# Altium schematic symbol library jlcpcb_2025_04_inductors_extended_0603.schlib: 1269 symbols (part 5 of 7) (continued)
## PWCWAQ1608F-150KTT (continued)
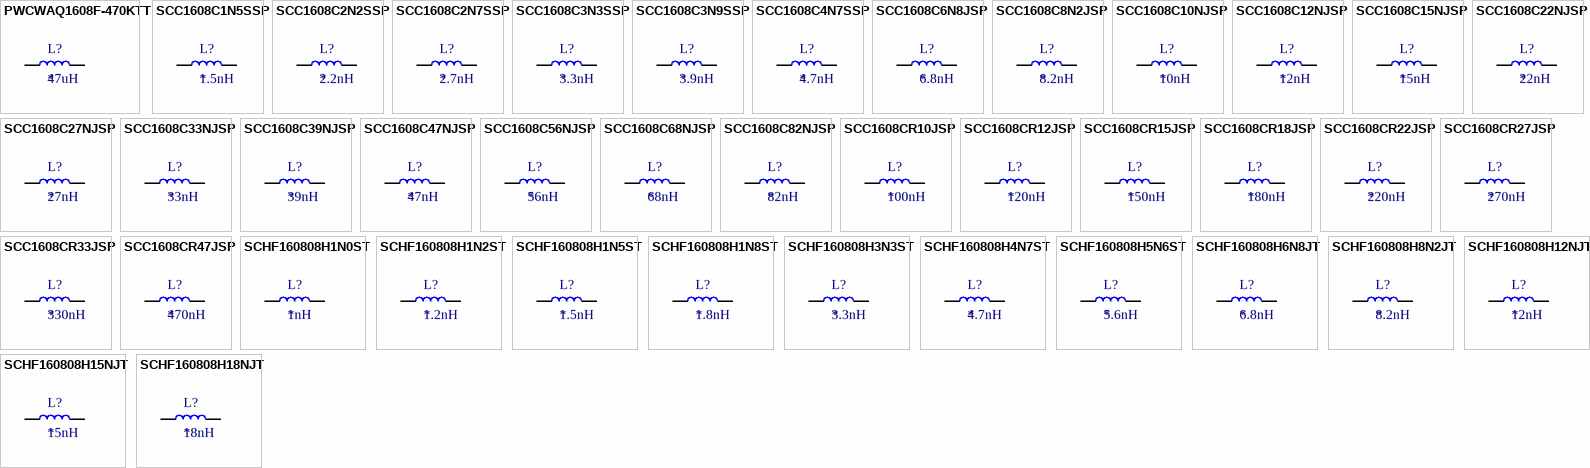
[diagram p23: symbols PWCWAQ1608F-470KTT to SCHF160808H18NJT]

## PWCWAQ1608F-470KTT
designator L?  Inductance: 47uH
Inductor, 47uH, ±10%, 8.645Ω, 100mA, SMD 0603; Manufacturer: PROD Tech; Manufacturer Part Number: PWCWAQ1608F-470KTT; Package Size: 0603; JLCPCB Basic Part: No; JLCPCB Part Number: C2983046; Supplier 1: LCSC; Category: Inductors; Supplier Part Number 1: C2983046; Tolerance: ±10%; Rated Current: 100mA; DC Resistance: 8.645Ω; RoHS: Yes; ComponentLink1Description: Datasheet; ComponentLink1URL: https://wmsc.lcsc.com/wmsc/upload/file/pdf/v2/lcsc/2205051716_PROD-Tech-PWCWAQ1608F-470KTT_C2983046.pdf; ComponentLink2Description: JLCPCB Part URL; ComponentLink2URL: https://jlcpcb.com/partdetail/C2983046; ComponentLink3Description: LCSC Part URL; ComponentLink3URL: https://lcsc.com/product-detail/Inductors-SMD_PROD-Tech-PROD-Tech-PWCWAQ1608F-470KTT_C2983046.html
footprint IND-0603 (0603 (1608M) Inductor)
pins: 1, 2

## SCC1608C1N5SSP
designator L?  Inductance: 1.5nH
Inductor, 1.5nH, 100mΩ, 500mA, SMD 0603; Manufacturer: Sunltech Tech; Manufacturer Part Number: SCC1608C1N5SSP; Package Size: 0603; JLCPCB Basic Part: No; JLCPCB Part Number: C412025; Supplier 1: LCSC; Category: Inductors; Supplier Part Number 1: C412025; Rated Current: 500mA; DC Resistance: 100mΩ; RoHS: Yes; ComponentLink1Description: Datasheet; ComponentLink1URL: https://wmsc.lcsc.com/wmsc/upload/file/pdf/v2/lcsc/2304140030_Sunltech-Tech-SCC1608C1N5SSP_C412025.pdf; ComponentLink2Description: JLCPCB Part URL; ComponentLink2URL: https://jlcpcb.com/partdetail/C412025; ComponentLink3Description: LCSC Part URL; ComponentLink3URL: https://lcsc.com/product-detail/Inductors-SMD_Sunltech-Tech-Sunltech-Tech-SCC1608C1N5SSP_C412025.html
footprint IND-0603 (0603 (1608M) Inductor)
pins: 1, 2

## SCC1608C2N2SSP
designator L?  Inductance: 2.2nH
Inductor, 2.2nH, 200mΩ, 500mA, SMD 0603; Manufacturer: Sunltech Tech; Manufacturer Part Number: SCC1608C2N2SSP; Package Size: 0603; JLCPCB Basic Part: No; JLCPCB Part Number: C412026; Supplier 1: LCSC; Category: Inductors; Supplier Part Number 1: C412026; Rated Current: 500mA; DC Resistance: 200mΩ; RoHS: Yes; ComponentLink1Description: Datasheet; ComponentLink1URL: https://wmsc.lcsc.com/wmsc/upload/file/pdf/v2/lcsc/2304140030_Sunltech-Tech-SCC1608C2N2SSP_C412026.pdf; ComponentLink2Description: JLCPCB Part URL; ComponentLink2URL: https://jlcpcb.com/partdetail/C412026; ComponentLink3Description: LCSC Part URL; ComponentLink3URL: https://lcsc.com/product-detail/Inductors-SMD_Sunltech-Tech-Sunltech-Tech-SCC1608C2N2SSP_C412026.html
footprint IND-0603 (0603 (1608M) Inductor)
pins: 1, 2

## SCC1608C2N7SSP
designator L?  Inductance: 2.7nH
Inductor, 2.7nH, 200mΩ, 500mA, SMD 0603; Manufacturer: Sunltech Tech; Manufacturer Part Number: SCC1608C2N7SSP; Package Size: 0603; JLCPCB Basic Part: No; JLCPCB Part Number: C412027; Supplier 1: LCSC; Category: Inductors; Supplier Part Number 1: C412027; Rated Current: 500mA; DC Resistance: 200mΩ; RoHS: Yes; ComponentLink1Description: Datasheet; ComponentLink1URL: https://wmsc.lcsc.com/wmsc/upload/file/pdf/v2/lcsc/2304140030_Sunltech-Tech-SCC1608C2N7SSP_C412027.pdf; ComponentLink2Description: JLCPCB Part URL; ComponentLink2URL: https://jlcpcb.com/partdetail/C412027; ComponentLink3Description: LCSC Part URL; ComponentLink3URL: https://lcsc.com/product-detail/Inductors-SMD_Sunltech-Tech-Sunltech-Tech-SCC1608C2N7SSP_C412027.html
footprint IND-0603 (0603 (1608M) Inductor)
pins: 1, 2

## SCC1608C3N3SSP
designator L?  Inductance: 3.3nH
Inductor, 3.3nH, 200mΩ, 500mA, SMD 0603; Manufacturer: Sunltech Tech; Manufacturer Part Number: SCC1608C3N3SSP; Package Size: 0603; JLCPCB Basic Part: No; JLCPCB Part Number: C412028; Supplier 1: LCSC; Category: Inductors; Supplier Part Number 1: C412028; Rated Current: 500mA; DC Resistance: 200mΩ; RoHS: Yes; ComponentLink1Description: Datasheet; ComponentLink1URL: https://wmsc.lcsc.com/wmsc/upload/file/pdf/v2/lcsc/2304140030_Sunltech-Tech-SCC1608C3N3SSP_C412028.pdf; ComponentLink2Description: JLCPCB Part URL; ComponentLink2URL: https://jlcpcb.com/partdetail/C412028; ComponentLink3Description: LCSC Part URL; ComponentLink3URL: https://lcsc.com/product-detail/Inductors-SMD_Sunltech-Tech-Sunltech-Tech-SCC1608C3N3SSP_C412028.html
footprint IND-0603 (0603 (1608M) Inductor)
pins: 1, 2

## SCC1608C3N9SSP
designator L?  Inductance: 3.9nH
Inductor, 3.9nH, 200mΩ, 500mA, SMD 0603; Manufacturer: Sunltech Tech; Manufacturer Part Number: SCC1608C3N9SSP; Package Size: 0603; JLCPCB Basic Part: No; JLCPCB Part Number: C412029; Supplier 1: LCSC; Category: Inductors; Supplier Part Number 1: C412029; Rated Current: 500mA; DC Resistance: 200mΩ; RoHS: Yes; ComponentLink1Description: Datasheet; ComponentLink1URL: https://wmsc.lcsc.com/wmsc/upload/file/pdf/v2/lcsc/2304140030_Sunltech-Tech-SCC1608C3N9SSP_C412029.pdf; ComponentLink2Description: JLCPCB Part URL; ComponentLink2URL: https://jlcpcb.com/partdetail/C412029; ComponentLink3Description: LCSC Part URL; ComponentLink3URL: https://lcsc.com/product-detail/Inductors-SMD_Sunltech-Tech-Sunltech-Tech-SCC1608C3N9SSP_C412029.html
footprint IND-0603 (0603 (1608M) Inductor)
pins: 1, 2

## SCC1608C4N7SSP
designator L?  Inductance: 4.7nH
Inductor, 4.7nH, 200mΩ, 500mA, SMD 0603; Manufacturer: Sunltech Tech; Manufacturer Part Number: SCC1608C4N7SSP; Package Size: 0603; JLCPCB Basic Part: No; JLCPCB Part Number: C412030; Supplier 1: LCSC; Category: Inductors; Supplier Part Number 1: C412030; Rated Current: 500mA; DC Resistance: 200mΩ; RoHS: Yes; ComponentLink1Description: Datasheet; ComponentLink1URL: https://wmsc.lcsc.com/wmsc/upload/file/pdf/v2/lcsc/2304140030_Sunltech-Tech-SCC1608C4N7SSP_C412030.pdf; ComponentLink2Description: JLCPCB Part URL; ComponentLink2URL: https://jlcpcb.com/partdetail/C412030; ComponentLink3Description: LCSC Part URL; ComponentLink3URL: https://lcsc.com/product-detail/Inductors-SMD_Sunltech-Tech-Sunltech-Tech-SCC1608C4N7SSP_C412030.html
footprint IND-0603 (0603 (1608M) Inductor)
pins: 1, 2

## SCC1608C6N8JSP
designator L?  Inductance: 6.8nH
Inductor, 6.8nH, ±5%, 300mΩ, 500mA, SMD 0603; Manufacturer: Sunltech Tech; Manufacturer Part Number: SCC1608C6N8JSP; Package Size: 0603; JLCPCB Basic Part: No; JLCPCB Part Number: C412031; Supplier 1: LCSC; Category: Inductors; Supplier Part Number 1: C412031; Tolerance: ±5%; Rated Current: 500mA; DC Resistance: 300mΩ; RoHS: Yes; ComponentLink1Description: Datasheet; ComponentLink1URL: https://wmsc.lcsc.com/wmsc/upload/file/pdf/v2/lcsc/2304140030_Sunltech-Tech-SCC1608C6N8JSP_C412031.pdf; ComponentLink2Description: JLCPCB Part URL; ComponentLink2URL: https://jlcpcb.com/partdetail/C412031; ComponentLink3Description: LCSC Part URL; ComponentLink3URL: https://lcsc.com/product-detail/Inductors-SMD_Sunltech-Tech-Sunltech-Tech-SCC1608C6N8JSP_C412031.html
footprint IND-0603 (0603 (1608M) Inductor)
pins: 1, 2

## SCC1608C8N2JSP
designator L?  Inductance: 8.2nH
Inductor, 8.2nH, ±5%, 300mΩ, 500mA, SMD 0603; Manufacturer: Sunltech Tech; Manufacturer Part Number: SCC1608C8N2JSP; Package Size: 0603; JLCPCB Basic Part: No; JLCPCB Part Number: C412032; Supplier 1: LCSC; Category: Inductors; Supplier Part Number 1: C412032; Tolerance: ±5%; Rated Current: 500mA; DC Resistance: 300mΩ; RoHS: Yes; ComponentLink1Description: Datasheet; ComponentLink1URL: https://wmsc.lcsc.com/wmsc/upload/file/pdf/v2/lcsc/2304140030_Sunltech-Tech-SCC1608C8N2JSP_C412032.pdf; ComponentLink2Description: JLCPCB Part URL; ComponentLink2URL: https://jlcpcb.com/partdetail/C412032; ComponentLink3Description: LCSC Part URL; ComponentLink3URL: https://lcsc.com/product-detail/Inductors-SMD_Sunltech-Tech-Sunltech-Tech-SCC1608C8N2JSP_C412032.html
footprint IND-0603 (0603 (1608M) Inductor)
pins: 1, 2

## SCC1608C10NJSP
designator L?  Inductance: 10nH
Inductor, 10nH, ±5%, 500mΩ, 300mA, SMD 0603; Manufacturer: Sunltech Tech; Manufacturer Part Number: SCC1608C10NJSP; Package Size: 0603; JLCPCB Basic Part: No; JLCPCB Part Number: C412033; Supplier 1: LCSC; Category: Inductors; Supplier Part Number 1: C412033; Tolerance: ±5%; Rated Current: 300mA; DC Resistance: 500mΩ; RoHS: Yes; ComponentLink1Description: Datasheet; ComponentLink1URL: https://wmsc.lcsc.com/wmsc/upload/file/pdf/v2/lcsc/2304140030_Sunltech-Tech-SCC1608C10NJSP_C412033.pdf; ComponentLink2Description: JLCPCB Part URL; ComponentLink2URL: https://jlcpcb.com/partdetail/C412033; ComponentLink3Description: LCSC Part URL; ComponentLink3URL: https://lcsc.com/product-detail/Inductors-SMD_Sunltech-Tech-Sunltech-Tech-SCC1608C10NJSP_C412033.html
footprint IND-0603 (0603 (1608M) Inductor)
pins: 1, 2

## SCC1608C12NJSP
designator L?  Inductance: 12nH
Inductor, 12nH, ±5%, 500mΩ, 300mA, SMD 0603; Manufacturer: Sunltech Tech; Manufacturer Part Number: SCC1608C12NJSP; Package Size: 0603; JLCPCB Basic Part: No; JLCPCB Part Number: C412034; Supplier 1: LCSC; Category: Inductors; Supplier Part Number 1: C412034; Tolerance: ±5%; Rated Current: 300mA; DC Resistance: 500mΩ; RoHS: Yes; ComponentLink1Description: Datasheet; ComponentLink1URL: https://wmsc.lcsc.com/wmsc/upload/file/pdf/v2/lcsc/2304140030_Sunltech-Tech-SCC1608C12NJSP_C412034.pdf; ComponentLink2Description: JLCPCB Part URL; ComponentLink2URL: https://jlcpcb.com/partdetail/C412034; ComponentLink3Description: LCSC Part URL; ComponentLink3URL: https://lcsc.com/product-detail/Inductors-SMD_Sunltech-Tech-Sunltech-Tech-SCC1608C12NJSP_C412034.html
footprint IND-0603 (0603 (1608M) Inductor)
pins: 1, 2

## SCC1608C15NJSP
designator L?  Inductance: 15nH
Inductor, 15nH, ±5%, 600mΩ, 300mA, SMD 0603; Manufacturer: Sunltech Tech; Manufacturer Part Number: SCC1608C15NJSP; Package Size: 0603; JLCPCB Basic Part: No; JLCPCB Part Number: C412035; Supplier 1: LCSC; Category: Inductors; Supplier Part Number 1: C412035; Tolerance: ±5%; Rated Current: 300mA; DC Resistance: 600mΩ; RoHS: Yes; ComponentLink1Description: Datasheet; ComponentLink1URL: https://wmsc.lcsc.com/wmsc/upload/file/pdf/v2/lcsc/2304140030_Sunltech-Tech-SCC1608C15NJSP_C412035.pdf; ComponentLink2Description: JLCPCB Part URL; ComponentLink2URL: https://jlcpcb.com/partdetail/C412035; ComponentLink3Description: LCSC Part URL; ComponentLink3URL: https://lcsc.com/product-detail/Inductors-SMD_Sunltech-Tech-Sunltech-Tech-SCC1608C15NJSP_C412035.html
footprint IND-0603 (0603 (1608M) Inductor)
pins: 1, 2

## SCC1608C22NJSP
designator L?  Inductance: 22nH
Inductor, 22nH, ±5%, 600mΩ, 300mA, SMD 0603; Manufacturer: Sunltech Tech; Manufacturer Part Number: SCC1608C22NJSP; Package Size: 0603; JLCPCB Basic Part: No; JLCPCB Part Number: C412036; Supplier 1: LCSC; Category: Inductors; Supplier Part Number 1: C412036; Tolerance: ±5%; Rated Current: 300mA; DC Resistance: 600mΩ; RoHS: Yes; ComponentLink1Description: Datasheet; ComponentLink1URL: https://wmsc.lcsc.com/wmsc/upload/file/pdf/v2/lcsc/2304140030_Sunltech-Tech-SCC1608C22NJSP_C412036.pdf; ComponentLink2Description: JLCPCB Part URL; ComponentLink2URL: https://jlcpcb.com/partdetail/C412036; ComponentLink3Description: LCSC Part URL; ComponentLink3URL: https://lcsc.com/product-detail/Inductors-SMD_Sunltech-Tech-Sunltech-Tech-SCC1608C22NJSP_C412036.html
footprint IND-0603 (0603 (1608M) Inductor)
pins: 1, 2

## SCC1608C27NJSP
designator L?  Inductance: 27nH
Inductor, 27nH, ±5%, 800mΩ, 300mA, SMD 0603; Manufacturer: Sunltech Tech; Manufacturer Part Number: SCC1608C27NJSP; Package Size: 0603; JLCPCB Basic Part: No; JLCPCB Part Number: C412037; Supplier 1: LCSC; Category: Inductors; Supplier Part Number 1: C412037; Tolerance: ±5%; Rated Current: 300mA; DC Resistance: 800mΩ; RoHS: Yes; ComponentLink1Description: Datasheet; ComponentLink1URL: https://wmsc.lcsc.com/wmsc/upload/file/pdf/v2/lcsc/2304140030_Sunltech-Tech-SCC1608C27NJSP_C412037.pdf; ComponentLink2Description: JLCPCB Part URL; ComponentLink2URL: https://jlcpcb.com/partdetail/C412037; ComponentLink3Description: LCSC Part URL; ComponentLink3URL: https://lcsc.com/product-detail/Inductors-SMD_Sunltech-Tech-Sunltech-Tech-SCC1608C27NJSP_C412037.html
footprint IND-0603 (0603 (1608M) Inductor)
pins: 1, 2

## SCC1608C33NJSP
designator L?  Inductance: 33nH
Inductor, 33nH, ±5%, 800mΩ, 300mA, SMD 0603; Manufacturer: Sunltech Tech; Manufacturer Part Number: SCC1608C33NJSP; Package Size: 0603; JLCPCB Basic Part: No; JLCPCB Part Number: C412038; Supplier 1: LCSC; Category: Inductors; Supplier Part Number 1: C412038; Tolerance: ±5%; Rated Current: 300mA; DC Resistance: 800mΩ; RoHS: Yes; ComponentLink1Description: Datasheet; ComponentLink1URL: https://wmsc.lcsc.com/wmsc/upload/file/pdf/v2/lcsc/2304140030_Sunltech-Tech-SCC1608C33NJSP_C412038.pdf; ComponentLink2Description: JLCPCB Part URL; ComponentLink2URL: https://jlcpcb.com/partdetail/C412038; ComponentLink3Description: LCSC Part URL; ComponentLink3URL: https://lcsc.com/product-detail/Inductors-SMD_Sunltech-Tech-Sunltech-Tech-SCC1608C33NJSP_C412038.html
footprint IND-0603 (0603 (1608M) Inductor)
pins: 1, 2

## SCC1608C39NJSP
designator L?  Inductance: 39nH
Inductor, 39nH, ±5%, 800mΩ, 300mA, SMD 0603; Manufacturer: Sunltech Tech; Manufacturer Part Number: SCC1608C39NJSP; Package Size: 0603; JLCPCB Basic Part: No; JLCPCB Part Number: C412039; Supplier 1: LCSC; Category: Inductors; Supplier Part Number 1: C412039; Tolerance: ±5%; Rated Current: 300mA; DC Resistance: 800mΩ; RoHS: Yes; ComponentLink1Description: Datasheet; ComponentLink1URL: https://wmsc.lcsc.com/wmsc/upload/file/pdf/v2/lcsc/2304140030_Sunltech-Tech-SCC1608C39NJSP_C412039.pdf; ComponentLink2Description: JLCPCB Part URL; ComponentLink2URL: https://jlcpcb.com/partdetail/C412039; ComponentLink3Description: LCSC Part URL; ComponentLink3URL: https://lcsc.com/product-detail/Inductors-SMD_Sunltech-Tech-Sunltech-Tech-SCC1608C39NJSP_C412039.html
footprint IND-0603 (0603 (1608M) Inductor)
pins: 1, 2

## SCC1608C47NJSP
designator L?  Inductance: 47nH
Inductor, 47nH, ±5%, 1Ω, 300mA, SMD 0603; Manufacturer: Sunltech Tech; Manufacturer Part Number: SCC1608C47NJSP; Package Size: 0603; JLCPCB Basic Part: No; JLCPCB Part Number: C412040; Supplier 1: LCSC; Category: Inductors; Supplier Part Number 1: C412040; Tolerance: ±5%; Rated Current: 300mA; DC Resistance: 1Ω; RoHS: Yes; ComponentLink1Description: Datasheet; ComponentLink1URL: https://wmsc.lcsc.com/wmsc/upload/file/pdf/v2/lcsc/2304140030_Sunltech-Tech-SCC1608C47NJSP_C412040.pdf; ComponentLink2Description: JLCPCB Part URL; ComponentLink2URL: https://jlcpcb.com/partdetail/C412040; ComponentLink3Description: LCSC Part URL; ComponentLink3URL: https://lcsc.com/product-detail/Inductors-SMD_Sunltech-Tech-Sunltech-Tech-SCC1608C47NJSP_C412040.html
footprint IND-0603 (0603 (1608M) Inductor)
pins: 1, 2

## SCC1608C56NJSP
designator L?  Inductance: 56nH
Inductor, 56nH, ±5%, 1Ω, 300mA, SMD 0603; Manufacturer: Sunltech Tech; Manufacturer Part Number: SCC1608C56NJSP; Package Size: 0603; JLCPCB Basic Part: No; JLCPCB Part Number: C412041; Supplier 1: LCSC; Category: Inductors; Supplier Part Number 1: C412041; Tolerance: ±5%; Rated Current: 300mA; DC Resistance: 1Ω; RoHS: Yes; ComponentLink1Description: Datasheet; ComponentLink1URL: https://wmsc.lcsc.com/wmsc/upload/file/pdf/v2/lcsc/2304140030_Sunltech-Tech-SCC1608C56NJSP_C412041.pdf; ComponentLink2Description: JLCPCB Part URL; ComponentLink2URL: https://jlcpcb.com/partdetail/C412041; ComponentLink3Description: LCSC Part URL; ComponentLink3URL: https://lcsc.com/product-detail/Inductors-SMD_Sunltech-Tech-Sunltech-Tech-SCC1608C56NJSP_C412041.html
footprint IND-0603 (0603 (1608M) Inductor)
pins: 1, 2

## SCC1608C68NJSP
designator L?  Inductance: 68nH
Inductor, 68nH, ±5%, 1Ω, 300mA, SMD 0603; Manufacturer: Sunltech Tech; Manufacturer Part Number: SCC1608C68NJSP; Package Size: 0603; JLCPCB Basic Part: No; JLCPCB Part Number: C412042; Supplier 1: LCSC; Category: Inductors; Supplier Part Number 1: C412042; Tolerance: ±5%; Rated Current: 300mA; DC Resistance: 1Ω; RoHS: Yes; ComponentLink1Description: Datasheet; ComponentLink1URL: https://wmsc.lcsc.com/wmsc/upload/file/pdf/v2/lcsc/2304140030_Sunltech-Tech-SCC1608C68NJSP_C412042.pdf; ComponentLink2Description: JLCPCB Part URL; ComponentLink2URL: https://jlcpcb.com/partdetail/C412042; ComponentLink3Description: LCSC Part URL; ComponentLink3URL: https://lcsc.com/product-detail/Inductors-SMD_Sunltech-Tech-Sunltech-Tech-SCC1608C68NJSP_C412042.html
footprint IND-0603 (0603 (1608M) Inductor)
pins: 1, 2

## SCC1608C82NJSP
designator L?  Inductance: 82nH
Inductor, 82nH, ±5%, 1Ω, 300mA, SMD 0603; Manufacturer: Sunltech Tech; Manufacturer Part Number: SCC1608C82NJSP; Package Size: 0603; JLCPCB Basic Part: No; JLCPCB Part Number: C412043; Supplier 1: LCSC; Category: Inductors; Supplier Part Number 1: C412043; Tolerance: ±5%; Rated Current: 300mA; DC Resistance: 1Ω; RoHS: Yes; ComponentLink1Description: Datasheet; ComponentLink1URL: https://wmsc.lcsc.com/wmsc/upload/file/pdf/v2/lcsc/2304140030_Sunltech-Tech-SCC1608C82NJSP_C412043.pdf; ComponentLink2Description: JLCPCB Part URL; ComponentLink2URL: https://jlcpcb.com/partdetail/C412043; ComponentLink3Description: LCSC Part URL; ComponentLink3URL: https://lcsc.com/product-detail/Inductors-SMD_Sunltech-Tech-Sunltech-Tech-SCC1608C82NJSP_C412043.html
footprint IND-0603 (0603 (1608M) Inductor)
pins: 1, 2

## SCC1608CR10JSP
designator L?  Inductance: 100nH
Inductor, 100nH, ±5%, 1.2Ω, 300mA, SMD 0603; Manufacturer: Sunltech Tech; Manufacturer Part Number: SCC1608CR10JSP; Package Size: 0603; JLCPCB Basic Part: No; JLCPCB Part Number: C412044; Supplier 1: LCSC; Category: Inductors; Supplier Part Number 1: C412044; Tolerance: ±5%; Rated Current: 300mA; DC Resistance: 1.2Ω; RoHS: Yes; ComponentLink1Description: Datasheet; ComponentLink1URL: https://wmsc.lcsc.com/wmsc/upload/file/pdf/v2/lcsc/2304140030_Sunltech-Tech-SCC1608CR10JSP_C412044.pdf; ComponentLink2Description: JLCPCB Part URL; ComponentLink2URL: https://jlcpcb.com/partdetail/C412044; ComponentLink3Description: LCSC Part URL; ComponentLink3URL: https://lcsc.com/product-detail/Inductors-SMD_Sunltech-Tech-Sunltech-Tech-SCC1608CR10JSP_C412044.html
footprint IND-0603 (0603 (1608M) Inductor)
pins: 1, 2

## SCC1608CR12JSP
designator L?  Inductance: 120nH
Inductor, 120nH, ±5%, 1.4Ω, 200mA, SMD 0603; Manufacturer: Sunltech Tech; Manufacturer Part Number: SCC1608CR12JSP; Package Size: 0603; JLCPCB Basic Part: No; JLCPCB Part Number: C412045; Supplier 1: LCSC; Category: Inductors; Supplier Part Number 1: C412045; Tolerance: ±5%; Rated Current: 200mA; DC Resistance: 1.4Ω; RoHS: Yes; ComponentLink1Description: Datasheet; ComponentLink1URL: https://wmsc.lcsc.com/wmsc/upload/file/pdf/v2/lcsc/2304140030_Sunltech-Tech-SCC1608CR12JSP_C412045.pdf; ComponentLink2Description: JLCPCB Part URL; ComponentLink2URL: https://jlcpcb.com/partdetail/C412045; ComponentLink3Description: LCSC Part URL; ComponentLink3URL: https://lcsc.com/product-detail/Inductors-SMD_Sunltech-Tech-Sunltech-Tech-SCC1608CR12JSP_C412045.html
footprint IND-0603 (0603 (1608M) Inductor)
pins: 1, 2

## SCC1608CR15JSP
designator L?  Inductance: 150nH
Inductor, 150nH, ±5%, 1.6Ω, 200mA, SMD 0603; Manufacturer: Sunltech Tech; Manufacturer Part Number: SCC1608CR15JSP; Package Size: 0603; JLCPCB Basic Part: No; JLCPCB Part Number: C412046; Supplier 1: LCSC; Category: Inductors; Supplier Part Number 1: C412046; Tolerance: ±5%; Rated Current: 200mA; DC Resistance: 1.6Ω; RoHS: Yes; ComponentLink1Description: Datasheet; ComponentLink1URL: https://wmsc.lcsc.com/wmsc/upload/file/pdf/v2/lcsc/2304140030_Sunltech-Tech-SCC1608CR15JSP_C412046.pdf; ComponentLink2Description: JLCPCB Part URL; ComponentLink2URL: https://jlcpcb.com/partdetail/C412046; ComponentLink3Description: LCSC Part URL; ComponentLink3URL: https://lcsc.com/product-detail/Inductors-SMD_Sunltech-Tech-Sunltech-Tech-SCC1608CR15JSP_C412046.html
footprint IND-0603 (0603 (1608M) Inductor)
pins: 1, 2

## SCC1608CR18JSP
designator L?  Inductance: 180nH
Inductor, 180nH, ±5%, 1.9Ω, 200mA, SMD 0603; Manufacturer: Sunltech Tech; Manufacturer Part Number: SCC1608CR18JSP; Package Size: 0603; JLCPCB Basic Part: No; JLCPCB Part Number: C412047; Supplier 1: LCSC; Category: Inductors; Supplier Part Number 1: C412047; Tolerance: ±5%; Rated Current: 200mA; DC Resistance: 1.9Ω; RoHS: Yes; ComponentLink1Description: Datasheet; ComponentLink1URL: https://wmsc.lcsc.com/wmsc/upload/file/pdf/v2/lcsc/2304140030_Sunltech-Tech-SCC1608CR18JSP_C412047.pdf; ComponentLink2Description: JLCPCB Part URL; ComponentLink2URL: https://jlcpcb.com/partdetail/C412047; ComponentLink3Description: LCSC Part URL; ComponentLink3URL: https://lcsc.com/product-detail/Inductors-SMD_Sunltech-Tech-Sunltech-Tech-SCC1608CR18JSP_C412047.html
footprint IND-0603 (0603 (1608M) Inductor)
pins: 1, 2

## SCC1608CR22JSP
designator L?  Inductance: 220nH
Inductor, 220nH, ±5%, 2.4Ω, 200mA, SMD 0603; Manufacturer: Sunltech Tech; Manufacturer Part Number: SCC1608CR22JSP; Package Size: 0603; JLCPCB Basic Part: No; JLCPCB Part Number: C412048; Supplier 1: LCSC; Category: Inductors; Supplier Part Number 1: C412048; Tolerance: ±5%; Rated Current: 200mA; DC Resistance: 2.4Ω; RoHS: Yes; ComponentLink1Description: Datasheet; ComponentLink1URL: https://wmsc.lcsc.com/wmsc/upload/file/pdf/v2/lcsc/2304140030_Sunltech-Tech-SCC1608CR22JSP_C412048.pdf; ComponentLink2Description: JLCPCB Part URL; ComponentLink2URL: https://jlcpcb.com/partdetail/C412048; ComponentLink3Description: LCSC Part URL; ComponentLink3URL: https://lcsc.com/product-detail/Inductors-SMD_Sunltech-Tech-Sunltech-Tech-SCC1608CR22JSP_C412048.html
footprint IND-0603 (0603 (1608M) Inductor)
pins: 1, 2

## SCC1608CR27JSP
designator L?  Inductance: 270nH
Inductor, 270nH, ±5%, 2.6Ω, 150mA, SMD 0603; Manufacturer: Sunltech Tech; Manufacturer Part Number: SCC1608CR27JSP; Package Size: 0603; JLCPCB Basic Part: No; JLCPCB Part Number: C412049; Supplier 1: LCSC; Category: Inductors; Supplier Part Number 1: C412049; Tolerance: ±5%; Rated Current: 150mA; DC Resistance: 2.6Ω; RoHS: Yes; ComponentLink1Description: Datasheet; ComponentLink1URL: https://wmsc.lcsc.com/wmsc/upload/file/pdf/v2/lcsc/2304140030_Sunltech-Tech-SCC1608CR27JSP_C412049.pdf; ComponentLink2Description: JLCPCB Part URL; ComponentLink2URL: https://jlcpcb.com/partdetail/C412049; ComponentLink3Description: LCSC Part URL; ComponentLink3URL: https://lcsc.com/product-detail/Inductors-SMD_Sunltech-Tech-Sunltech-Tech-SCC1608CR27JSP_C412049.html
footprint IND-0603 (0603 (1608M) Inductor)
pins: 1, 2

## SCC1608CR33JSP
designator L?  Inductance: 330nH
Inductor, 330nH, ±5%, 2.8Ω, 150mA, SMD 0603; Manufacturer: Sunltech Tech; Manufacturer Part Number: SCC1608CR33JSP; Package Size: 0603; JLCPCB Basic Part: No; JLCPCB Part Number: C412050; Supplier 1: LCSC; Category: Inductors; Supplier Part Number 1: C412050; Tolerance: ±5%; Rated Current: 150mA; DC Resistance: 2.8Ω; RoHS: Yes; ComponentLink1Description: Datasheet; ComponentLink1URL: https://wmsc.lcsc.com/wmsc/upload/file/pdf/v2/lcsc/2304140030_Sunltech-Tech-SCC1608CR33JSP_C412050.pdf; ComponentLink2Description: JLCPCB Part URL; ComponentLink2URL: https://jlcpcb.com/partdetail/C412050; ComponentLink3Description: LCSC Part URL; ComponentLink3URL: https://lcsc.com/product-detail/Inductors-SMD_Sunltech-Tech-Sunltech-Tech-SCC1608CR33JSP_C412050.html
footprint IND-0603 (0603 (1608M) Inductor)
pins: 1, 2

## SCC1608CR47JSP
designator L?  Inductance: 470nH
Inductor, 470nH, ±5%, 3.6Ω, 150mA, SMD 0603; Manufacturer: Sunltech Tech; Manufacturer Part Number: SCC1608CR47JSP; Package Size: 0603; JLCPCB Basic Part: No; JLCPCB Part Number: C412052; Supplier 1: LCSC; Category: Inductors; Supplier Part Number 1: C412052; Tolerance: ±5%; Rated Current: 150mA; DC Resistance: 3.6Ω; RoHS: Yes; ComponentLink1Description: Datasheet; ComponentLink1URL: https://wmsc.lcsc.com/wmsc/upload/file/pdf/v2/lcsc/1912111437_Sunltech-Tech-SCC1608CR47JSP_C412052.pdf; ComponentLink2Description: JLCPCB Part URL; ComponentLink2URL: https://jlcpcb.com/partdetail/C412052; ComponentLink3Description: LCSC Part URL; ComponentLink3URL: https://lcsc.com/product-detail/Inductors-SMD_Sunltech-Tech-Sunltech-Tech-SCC1608CR47JSP_C412052.html
footprint IND-0603 (0603 (1608M) Inductor)
pins: 1, 2

## SCHF160808H1N0ST
designator L?  Inductance: 1nH
Inductor, 1nH, 50mΩ, 500mA, SMD 0603; Manufacturer: Yanchuang; Manufacturer Part Number: SCHF160808H1N0ST; Package Size: 0603; JLCPCB Basic Part: No; JLCPCB Part Number: C577981; Supplier 1: LCSC; Category: Inductors; Supplier Part Number 1: C577981; Rated Current: 500mA; DC Resistance: 50mΩ; RoHS: Yes; ComponentLink1Description: Datasheet; ComponentLink1URL: https://wmsc.lcsc.com/wmsc/upload/file/pdf/v2/lcsc/2304140030_Yanchuang-SCHF160808H1N0ST_C577981.pdf; ComponentLink2Description: JLCPCB Part URL; ComponentLink2URL: https://jlcpcb.com/partdetail/C577981; ComponentLink3Description: LCSC Part URL; ComponentLink3URL: https://lcsc.com/product-detail/Inductors-SMD_Yanchuang-Yanchuang-SCHF160808H1N0ST_C577981.html
footprint IND-0603 (0603 (1608M) Inductor)
pins: 1, 2

## SCHF160808H1N2ST
designator L?  Inductance: 1.2nH
Inductor, 1.2nH, 100mΩ, 500mA, SMD 0603; Manufacturer: Yanchuang; Manufacturer Part Number: SCHF160808H1N2ST; Package Size: 0603; JLCPCB Basic Part: No; JLCPCB Part Number: C577982; Supplier 1: LCSC; Category: Inductors; Supplier Part Number 1: C577982; Rated Current: 500mA; DC Resistance: 100mΩ; RoHS: Yes; ComponentLink1Description: Datasheet; ComponentLink1URL: https://wmsc.lcsc.com/wmsc/upload/file/pdf/v2/lcsc/2304140030_Yanchuang-SCHF160808H1N2ST_C577982.pdf; ComponentLink2Description: JLCPCB Part URL; ComponentLink2URL: https://jlcpcb.com/partdetail/C577982; ComponentLink3Description: LCSC Part URL; ComponentLink3URL: https://lcsc.com/product-detail/Inductors-SMD_Yanchuang-Yanchuang-SCHF160808H1N2ST_C577982.html
footprint IND-0603 (0603 (1608M) Inductor)
pins: 1, 2

## SCHF160808H1N5ST
designator L?  Inductance: 1.5nH
Inductor, 1.5nH, 100mΩ, 400mA, SMD 0603; Manufacturer: Yanchuang; Manufacturer Part Number: SCHF160808H1N5ST; Package Size: 0603; JLCPCB Basic Part: No; JLCPCB Part Number: C577983; Supplier 1: LCSC; Category: Inductors; Supplier Part Number 1: C577983; Rated Current: 400mA; DC Resistance: 100mΩ; RoHS: Yes; ComponentLink1Description: Datasheet; ComponentLink1URL: https://wmsc.lcsc.com/wmsc/upload/file/pdf/v2/lcsc/2304140030_Yanchuang-SCHF160808H1N5ST_C577983.pdf; ComponentLink2Description: JLCPCB Part URL; ComponentLink2URL: https://jlcpcb.com/partdetail/C577983; ComponentLink3Description: LCSC Part URL; ComponentLink3URL: https://lcsc.com/product-detail/Inductors-SMD_Yanchuang-Yanchuang-SCHF160808H1N5ST_C577983.html
footprint IND-0603 (0603 (1608M) Inductor)
pins: 1, 2

## SCHF160808H1N8ST
designator L?  Inductance: 1.8nH
Inductor, 1.8nH, 120mΩ, 400mA, SMD 0603; Manufacturer: Yanchuang; Manufacturer Part Number: SCHF160808H1N8ST; Package Size: 0603; JLCPCB Basic Part: No; JLCPCB Part Number: C577984; Supplier 1: LCSC; Category: Inductors; Supplier Part Number 1: C577984; Rated Current: 400mA; DC Resistance: 120mΩ; RoHS: Yes; ComponentLink1Description: Datasheet; ComponentLink1URL: https://wmsc.lcsc.com/wmsc/upload/file/pdf/v2/lcsc/2304140030_Yanchuang-SCHF160808H1N8ST_C577984.pdf; ComponentLink2Description: JLCPCB Part URL; ComponentLink2URL: https://jlcpcb.com/partdetail/C577984; ComponentLink3Description: LCSC Part URL; ComponentLink3URL: https://lcsc.com/product-detail/Inductors-SMD_Yanchuang-Yanchuang-SCHF160808H1N8ST_C577984.html
footprint IND-0603 (0603 (1608M) Inductor)
pins: 1, 2

## SCHF160808H3N3ST
designator L?  Inductance: 3.3nH
Inductor, 3.3nH, 200mΩ, 400mA, SMD 0603; Manufacturer: Yanchuang; Manufacturer Part Number: SCHF160808H3N3ST; Package Size: 0603; JLCPCB Basic Part: No; JLCPCB Part Number: C577987; Supplier 1: LCSC; Category: Inductors; Supplier Part Number 1: C577987; Rated Current: 400mA; DC Resistance: 200mΩ; RoHS: Yes; ComponentLink1Description: Datasheet; ComponentLink1URL: https://wmsc.lcsc.com/wmsc/upload/file/pdf/v2/lcsc/2304140030_Yanchuang-SCHF160808H3N3ST_C577987.pdf; ComponentLink2Description: JLCPCB Part URL; ComponentLink2URL: https://jlcpcb.com/partdetail/C577987; ComponentLink3Description: LCSC Part URL; ComponentLink3URL: https://lcsc.com/product-detail/Inductors-SMD_Yanchuang-Yanchuang-SCHF160808H3N3ST_C577987.html
footprint IND-0603 (0603 (1608M) Inductor)
pins: 1, 2

## SCHF160808H4N7ST
designator L?  Inductance: 4.7nH
Inductor, 4.7nH, 300mΩ, 400mA, SMD 0603; Manufacturer: Yanchuang; Manufacturer Part Number: SCHF160808H4N7ST; Package Size: 0603; JLCPCB Basic Part: No; JLCPCB Part Number: C577989; Supplier 1: LCSC; Category: Inductors; Supplier Part Number 1: C577989; Rated Current: 400mA; DC Resistance: 300mΩ; RoHS: Yes; ComponentLink1Description: Datasheet; ComponentLink1URL: https://wmsc.lcsc.com/wmsc/upload/file/pdf/v2/lcsc/2304140030_Yanchuang-SCHF160808H4N7ST_C577989.pdf; ComponentLink2Description: JLCPCB Part URL; ComponentLink2URL: https://jlcpcb.com/partdetail/C577989; ComponentLink3Description: LCSC Part URL; ComponentLink3URL: https://lcsc.com/product-detail/Inductors-SMD_Yanchuang-Yanchuang-SCHF160808H4N7ST_C577989.html
footprint IND-0603 (0603 (1608M) Inductor)
pins: 1, 2

## SCHF160808H5N6ST
designator L?  Inductance: 5.6nH
Inductor, 5.6nH, 300mΩ, 400mA, SMD 0603; Manufacturer: Yanchuang; Manufacturer Part Number: SCHF160808H5N6ST; Package Size: 0603; JLCPCB Basic Part: No; JLCPCB Part Number: C577990; Supplier 1: LCSC; Category: Inductors; Supplier Part Number 1: C577990; Rated Current: 400mA; DC Resistance: 300mΩ; RoHS: Yes; ComponentLink1Description: Datasheet; ComponentLink1URL: https://wmsc.lcsc.com/wmsc/upload/file/pdf/v2/lcsc/2304140030_Yanchuang-SCHF160808H5N6ST_C577990.pdf; ComponentLink2Description: JLCPCB Part URL; ComponentLink2URL: https://jlcpcb.com/partdetail/C577990; ComponentLink3Description: LCSC Part URL; ComponentLink3URL: https://lcsc.com/product-detail/Inductors-SMD_Yanchuang-Yanchuang-SCHF160808H5N6ST_C577990.html
footprint IND-0603 (0603 (1608M) Inductor)
pins: 1, 2

## SCHF160808H6N8JT
designator L?  Inductance: 6.8nH
Inductor, 6.8nH, ±5%, 350mΩ, 400mA, SMD 0603; Manufacturer: Yanchuang; Manufacturer Part Number: SCHF160808H6N8JT; Package Size: 0603; JLCPCB Basic Part: No; JLCPCB Part Number: C577991; Supplier 1: LCSC; Category: Inductors; Supplier Part Number 1: C577991; Tolerance: ±5%; Rated Current: 400mA; DC Resistance: 350mΩ; RoHS: Yes; ComponentLink1Description: Datasheet; ComponentLink1URL: https://wmsc.lcsc.com/wmsc/upload/file/pdf/v2/lcsc/2304140030_Yanchuang-SCHF160808H6N8JT_C577991.pdf; ComponentLink2Description: JLCPCB Part URL; ComponentLink2URL: https://jlcpcb.com/partdetail/C577991; ComponentLink3Description: LCSC Part URL; ComponentLink3URL: https://lcsc.com/product-detail/Inductors-SMD_Yanchuang-Yanchuang-SCHF160808H6N8JT_C577991.html
footprint IND-0603 (0603 (1608M) Inductor)
pins: 1, 2

## SCHF160808H8N2JT
designator L?  Inductance: 8.2nH
Inductor, 8.2nH, ±5%, 350mΩ, 400mA, SMD 0603; Manufacturer: Yanchuang; Manufacturer Part Number: SCHF160808H8N2JT; Package Size: 0603; JLCPCB Basic Part: No; JLCPCB Part Number: C577992; Supplier 1: LCSC; Category: Inductors; Supplier Part Number 1: C577992; Tolerance: ±5%; Rated Current: 400mA; DC Resistance: 350mΩ; RoHS: Yes; ComponentLink1Description: Datasheet; ComponentLink1URL: https://wmsc.lcsc.com/wmsc/upload/file/pdf/v2/lcsc/2304140030_Yanchuang-SCHF160808H8N2JT_C577992.pdf; ComponentLink2Description: JLCPCB Part URL; ComponentLink2URL: https://jlcpcb.com/partdetail/C577992; ComponentLink3Description: LCSC Part URL; ComponentLink3URL: https://lcsc.com/product-detail/Inductors-SMD_Yanchuang-Yanchuang-SCHF160808H8N2JT_C577992.html
footprint IND-0603 (0603 (1608M) Inductor)
pins: 1, 2

## SCHF160808H12NJT
designator L?  Inductance: 12nH
Inductor, 12nH, ±5%, 400mΩ, 300mA, SMD 0603; Manufacturer: Yanchuang; Manufacturer Part Number: SCHF160808H12NJT; Package Size: 0603; JLCPCB Basic Part: No; JLCPCB Part Number: C577994; Supplier 1: LCSC; Category: Inductors; Supplier Part Number 1: C577994; Tolerance: ±5%; Rated Current: 300mA; DC Resistance: 400mΩ; RoHS: Yes; ComponentLink1Description: Datasheet; ComponentLink1URL: https://wmsc.lcsc.com/wmsc/upload/file/pdf/v2/lcsc/2304140030_Yanchuang-SCHF160808H12NJT_C577994.pdf; ComponentLink2Description: JLCPCB Part URL; ComponentLink2URL: https://jlcpcb.com/partdetail/C577994; ComponentLink3Description: LCSC Part URL; ComponentLink3URL: https://lcsc.com/product-detail/Inductors-SMD_Yanchuang-Yanchuang-SCHF160808H12NJT_C577994.html
footprint IND-0603 (0603 (1608M) Inductor)
pins: 1, 2

## SCHF160808H15NJT
designator L?  Inductance: 15nH
Inductor, 15nH, ±5%, 450mΩ, 300mA, SMD 0603; Manufacturer: Yanchuang; Manufacturer Part Number: SCHF160808H15NJT; Package Size: 0603; JLCPCB Basic Part: No; JLCPCB Part Number: C577995; Supplier 1: LCSC; Category: Inductors; Supplier Part Number 1: C577995; Tolerance: ±5%; Rated Current: 300mA; DC Resistance: 450mΩ; RoHS: Yes; ComponentLink1Description: Datasheet; ComponentLink1URL: https://wmsc.lcsc.com/wmsc/upload/file/pdf/v2/lcsc/2304140030_Yanchuang-SCHF160808H15NJT_C577995.pdf; ComponentLink2Description: JLCPCB Part URL; ComponentLink2URL: https://jlcpcb.com/partdetail/C577995; ComponentLink3Description: LCSC Part URL; ComponentLink3URL: https://lcsc.com/product-detail/Inductors-SMD_Yanchuang-Yanchuang-SCHF160808H15NJT_C577995.html
footprint IND-0603 (0603 (1608M) Inductor)
pins: 1, 2

## SCHF160808H18NJT
designator L?  Inductance: 18nH
Inductor, 18nH, ±5%, 600mΩ, 300mA, SMD 0603; Manufacturer: Yanchuang; Manufacturer Part Number: SCHF160808H18NJT; Package Size: 0603; JLCPCB Basic Part: No; JLCPCB Part Number: C577996; Supplier 1: LCSC; Category: Inductors; Supplier Part Number 1: C577996; Tolerance: ±5%; Rated Current: 300mA; DC Resistance: 600mΩ; RoHS: Yes; ComponentLink1Description: Datasheet; ComponentLink1URL: https://wmsc.lcsc.com/wmsc/upload/file/pdf/v2/lcsc/2304140030_Yanchuang-SCHF160808H18NJT_C577996.pdf; ComponentLink2Description: JLCPCB Part URL; ComponentLink2URL: https://jlcpcb.com/partdetail/C577996; ComponentLink3Description: LCSC Part URL; ComponentLink3URL: https://lcsc.com/product-detail/Inductors-SMD_Yanchuang-Yanchuang-SCHF160808H18NJT_C577996.html
footprint IND-0603 (0603 (1608M) Inductor)
pins: 1, 2

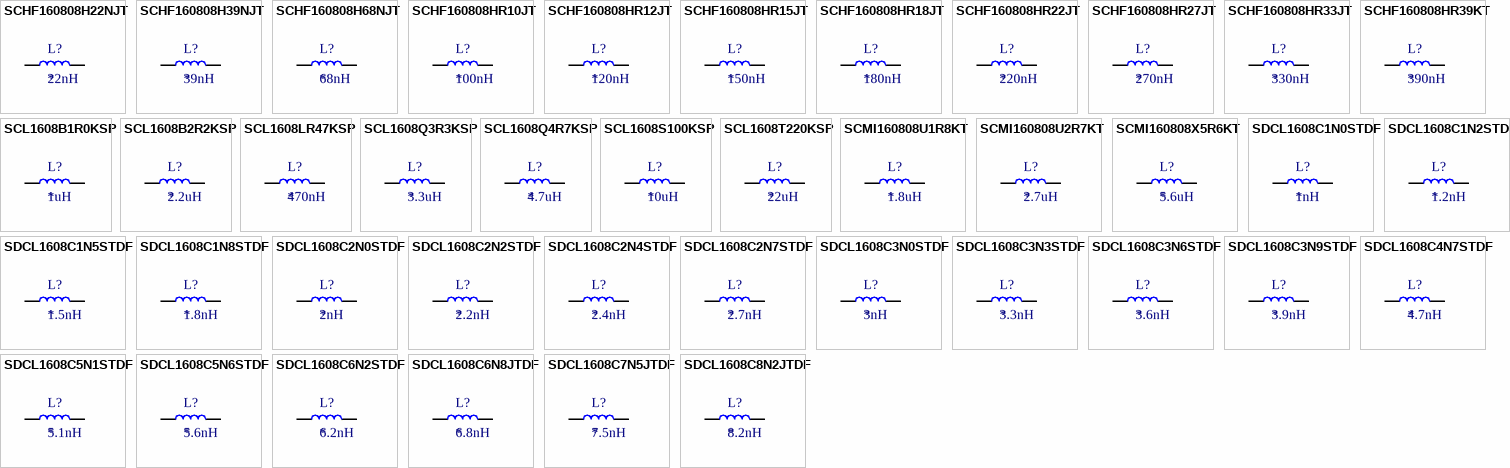
[diagram p24: symbols SCHF160808H22NJT to SDCL1608C8N2JTDF]

## SCHF160808H22NJT
designator L?  Inductance: 22nH
Inductor, 22nH, ±5%, 600mΩ, 300mA, SMD 0603; Manufacturer: Yanchuang; Manufacturer Part Number: SCHF160808H22NJT; Package Size: 0603; JLCPCB Basic Part: No; JLCPCB Part Number: C577997; Supplier 1: LCSC; Category: Inductors; Supplier Part Number 1: C577997; Tolerance: ±5%; Rated Current: 300mA; DC Resistance: 600mΩ; RoHS: Yes; ComponentLink1Description: Datasheet; ComponentLink1URL: https://wmsc.lcsc.com/wmsc/upload/file/pdf/v2/lcsc/2304140030_Yanchuang-SCHF160808H22NJT_C577997.pdf; ComponentLink2Description: JLCPCB Part URL; ComponentLink2URL: https://jlcpcb.com/partdetail/C577997; ComponentLink3Description: LCSC Part URL; ComponentLink3URL: https://lcsc.com/product-detail/Inductors-SMD_Yanchuang-Yanchuang-SCHF160808H22NJT_C577997.html
footprint IND-0603 (0603 (1608M) Inductor)
pins: 1, 2

## SCHF160808H39NJT
designator L?  Inductance: 39nH
Inductor, 39nH, ±5%, 1Ω, 300mA, SMD 0603; Manufacturer: Yanchuang; Manufacturer Part Number: SCHF160808H39NJT; Package Size: 0603; JLCPCB Basic Part: No; JLCPCB Part Number: C578000; Supplier 1: LCSC; Category: Inductors; Supplier Part Number 1: C578000; Tolerance: ±5%; Rated Current: 300mA; DC Resistance: 1Ω; RoHS: Yes; ComponentLink1Description: Datasheet; ComponentLink1URL: https://wmsc.lcsc.com/wmsc/upload/file/pdf/v2/lcsc/2304140030_Yanchuang-SCHF160808H39NJT_C578000.pdf; ComponentLink2Description: JLCPCB Part URL; ComponentLink2URL: https://jlcpcb.com/partdetail/C578000; ComponentLink3Description: LCSC Part URL; ComponentLink3URL: https://lcsc.com/product-detail/Inductors-SMD_Yanchuang-Yanchuang-SCHF160808H39NJT_C578000.html
footprint IND-0603 (0603 (1608M) Inductor)
pins: 1, 2

## SCHF160808H68NJT
designator L?  Inductance: 68nH
Inductor, 68nH, ±5%, 1Ω, 200mA, SMD 0603; Manufacturer: Yanchuang; Manufacturer Part Number: SCHF160808H68NJT; Package Size: 0603; JLCPCB Basic Part: No; JLCPCB Part Number: C578003; Supplier 1: LCSC; Category: Inductors; Supplier Part Number 1: C578003; Tolerance: ±5%; Rated Current: 200mA; DC Resistance: 1Ω; RoHS: Yes; ComponentLink1Description: Datasheet; ComponentLink1URL: https://wmsc.lcsc.com/wmsc/upload/file/pdf/v2/lcsc/2304140030_Yanchuang-SCHF160808H68NJT_C578003.pdf; ComponentLink2Description: JLCPCB Part URL; ComponentLink2URL: https://jlcpcb.com/partdetail/C578003; ComponentLink3Description: LCSC Part URL; ComponentLink3URL: https://lcsc.com/product-detail/Inductors-SMD_Yanchuang-Yanchuang-SCHF160808H68NJT_C578003.html
footprint IND-0603 (0603 (1608M) Inductor)
pins: 1, 2

## SCHF160808HR10JT
designator L?  Inductance: 100nH
Inductor, 100nH, ±5%, 1.4Ω, 200mA, SMD 0603; Manufacturer: Yanchuang; Manufacturer Part Number: SCHF160808HR10JT; Package Size: 0603; JLCPCB Basic Part: No; JLCPCB Part Number: C578005; Supplier 1: LCSC; Category: Inductors; Supplier Part Number 1: C578005; Tolerance: ±5%; Rated Current: 200mA; DC Resistance: 1.4Ω; RoHS: Yes; ComponentLink1Description: Datasheet; ComponentLink1URL: https://wmsc.lcsc.com/wmsc/upload/file/pdf/v2/lcsc/2304140030_Yanchuang-SCHF160808HR10JT_C578005.pdf; ComponentLink2Description: JLCPCB Part URL; ComponentLink2URL: https://jlcpcb.com/partdetail/C578005; ComponentLink3Description: LCSC Part URL; ComponentLink3URL: https://lcsc.com/product-detail/Inductors-SMD_Yanchuang-Yanchuang-SCHF160808HR10JT_C578005.html
footprint IND-0603 (0603 (1608M) Inductor)
pins: 1, 2

## SCHF160808HR12JT
designator L?  Inductance: 120nH
Inductor, 120nH, ±5%, 1.6Ω, 150mA, SMD 0603; Manufacturer: Yanchuang; Manufacturer Part Number: SCHF160808HR12JT; Package Size: 0603; JLCPCB Basic Part: No; JLCPCB Part Number: C578006; Supplier 1: LCSC; Category: Inductors; Supplier Part Number 1: C578006; Tolerance: ±5%; Rated Current: 150mA; DC Resistance: 1.6Ω; RoHS: Yes; ComponentLink1Description: Datasheet; ComponentLink1URL: https://wmsc.lcsc.com/wmsc/upload/file/pdf/v2/lcsc/2304140030_Yanchuang-SCHF160808HR12JT_C578006.pdf; ComponentLink2Description: JLCPCB Part URL; ComponentLink2URL: https://jlcpcb.com/partdetail/C578006; ComponentLink3Description: LCSC Part URL; ComponentLink3URL: https://lcsc.com/product-detail/Inductors-SMD_Yanchuang-Yanchuang-SCHF160808HR12JT_C578006.html
footprint IND-0603 (0603 (1608M) Inductor)
pins: 1, 2

## SCHF160808HR15JT
designator L?  Inductance: 150nH
Inductor, 150nH, ±5%, 1.8Ω, 150mA, SMD 0603; Manufacturer: Yanchuang; Manufacturer Part Number: SCHF160808HR15JT; Package Size: 0603; JLCPCB Basic Part: No; JLCPCB Part Number: C578007; Supplier 1: LCSC; Category: Inductors; Supplier Part Number 1: C578007; Tolerance: ±5%; Rated Current: 150mA; DC Resistance: 1.8Ω; RoHS: Yes; ComponentLink1Description: Datasheet; ComponentLink1URL: https://wmsc.lcsc.com/wmsc/upload/file/pdf/v2/lcsc/2304140030_Yanchuang-SCHF160808HR15JT_C578007.pdf; ComponentLink2Description: JLCPCB Part URL; ComponentLink2URL: https://jlcpcb.com/partdetail/C578007; ComponentLink3Description: LCSC Part URL; ComponentLink3URL: https://lcsc.com/product-detail/Inductors-SMD_Yanchuang-Yanchuang-SCHF160808HR15JT_C578007.html
footprint IND-0603 (0603 (1608M) Inductor)
pins: 1, 2

## SCHF160808HR18JT
designator L?  Inductance: 180nH
Inductor, 180nH, ±5%, 1.8Ω, 150mA, SMD 0603; Manufacturer: Yanchuang; Manufacturer Part Number: SCHF160808HR18JT; Package Size: 0603; JLCPCB Basic Part: No; JLCPCB Part Number: C578008; Supplier 1: LCSC; Category: Inductors; Supplier Part Number 1: C578008; Tolerance: ±5%; Rated Current: 150mA; DC Resistance: 1.8Ω; RoHS: Yes; ComponentLink1Description: Datasheet; ComponentLink1URL: https://wmsc.lcsc.com/wmsc/upload/file/pdf/v2/lcsc/2304140030_Yanchuang-SCHF160808HR18JT_C578008.pdf; ComponentLink2Description: JLCPCB Part URL; ComponentLink2URL: https://jlcpcb.com/partdetail/C578008; ComponentLink3Description: LCSC Part URL; ComponentLink3URL: https://lcsc.com/product-detail/Inductors-SMD_Yanchuang-Yanchuang-SCHF160808HR18JT_C578008.html
footprint IND-0603 (0603 (1608M) Inductor)
pins: 1, 2

## SCHF160808HR22JT
designator L?  Inductance: 220nH
Inductor, 220nH, ±5%, 2.4Ω, 150mA, SMD 0603; Manufacturer: Yanchuang; Manufacturer Part Number: SCHF160808HR22JT; Package Size: 0603; JLCPCB Basic Part: No; JLCPCB Part Number: C578009; Supplier 1: LCSC; Category: Inductors; Supplier Part Number 1: C578009; Tolerance: ±5%; Rated Current: 150mA; DC Resistance: 2.4Ω; RoHS: Yes; ComponentLink1Description: Datasheet; ComponentLink1URL: https://wmsc.lcsc.com/wmsc/upload/file/pdf/v2/lcsc/2304140030_Yanchuang-SCHF160808HR22JT_C578009.pdf; ComponentLink2Description: JLCPCB Part URL; ComponentLink2URL: https://jlcpcb.com/partdetail/C578009; ComponentLink3Description: LCSC Part URL; ComponentLink3URL: https://lcsc.com/product-detail/Inductors-SMD_Yanchuang-Yanchuang-SCHF160808HR22JT_C578009.html
footprint IND-0603 (0603 (1608M) Inductor)
pins: 1, 2

## SCHF160808HR27JT
designator L?  Inductance: 270nH
Inductor, 270nH, ±5%, 2.6Ω, 150mA, SMD 0603; Manufacturer: Yanchuang; Manufacturer Part Number: SCHF160808HR27JT; Package Size: 0603; JLCPCB Basic Part: No; JLCPCB Part Number: C578010; Supplier 1: LCSC; Category: Inductors; Supplier Part Number 1: C578010; Tolerance: ±5%; Rated Current: 150mA; DC Resistance: 2.6Ω; RoHS: Yes; ComponentLink1Description: Datasheet; ComponentLink1URL: https://wmsc.lcsc.com/wmsc/upload/file/pdf/v2/lcsc/2304140030_Yanchuang-SCHF160808HR27JT_C578010.pdf; ComponentLink2Description: JLCPCB Part URL; ComponentLink2URL: https://jlcpcb.com/partdetail/C578010; ComponentLink3Description: LCSC Part URL; ComponentLink3URL: https://lcsc.com/product-detail/Inductors-SMD_Yanchuang-Yanchuang-SCHF160808HR27JT_C578010.html
footprint IND-0603 (0603 (1608M) Inductor)
pins: 1, 2

## SCHF160808HR33JT
designator L?  Inductance: 330nH
Inductor, 330nH, ±5%, 2.8Ω, 150mA, SMD 0603; Manufacturer: Yanchuang; Manufacturer Part Number: SCHF160808HR33JT; Package Size: 0603; JLCPCB Basic Part: No; JLCPCB Part Number: C578011; Supplier 1: LCSC; Category: Inductors; Supplier Part Number 1: C578011; Tolerance: ±5%; Rated Current: 150mA; DC Resistance: 2.8Ω; RoHS: Yes; ComponentLink1Description: Datasheet; ComponentLink1URL: https://wmsc.lcsc.com/wmsc/upload/file/pdf/v2/lcsc/2304140030_Yanchuang-SCHF160808HR33JT_C578011.pdf; ComponentLink2Description: JLCPCB Part URL; ComponentLink2URL: https://jlcpcb.com/partdetail/C578011; ComponentLink3Description: LCSC Part URL; ComponentLink3URL: https://lcsc.com/product-detail/Inductors-SMD_Yanchuang-Yanchuang-SCHF160808HR33JT_C578011.html
footprint IND-0603 (0603 (1608M) Inductor)
pins: 1, 2

## SCHF160808HR39KT
designator L?  Inductance: 390nH
Inductor, 390nH, ±10%, 3.2Ω, 50mA, SMD 0603; Manufacturer: Yanchuang; Manufacturer Part Number: SCHF160808HR39KT; Self-Resonant Frequency: 300MHz; Q Factor: 50@8MHz; Package Size: 0603; JLCPCB Basic Part: No; JLCPCB Part Number: C578012; Supplier 1: LCSC; Category: Inductors; Supplier Part Number 1: C578012; Tolerance: ±10%; Rated Current: 50mA; DC Resistance: 3.2Ω; RoHS: Yes; ComponentLink1Description: Datasheet; ComponentLink1URL: https://wmsc.lcsc.com/wmsc/upload/file/pdf/v2/lcsc/2304140030_Yanchuang-SCHF160808HR39KT_C578012.pdf; ComponentLink2Description: JLCPCB Part URL; ComponentLink2URL: https://jlcpcb.com/partdetail/C578012; ComponentLink3Description: LCSC Part URL; ComponentLink3URL: https://lcsc.com/product-detail/Inductors-SMD_Yanchuang-Yanchuang-SCHF160808HR39KT_C578012.html
footprint IND-0603 (0603 (1608M) Inductor)
pins: 1, 2

## SCL1608B1R0KSP
designator L?  Inductance: 1uH
Inductor, 1uH, ±10%, 700mΩ, 25mA, SMD 0603; Manufacturer: Sunltech Tech; Manufacturer Part Number: SCL1608B1R0KSP; Package Size: 0603; JLCPCB Basic Part: No; JLCPCB Part Number: C411946; Supplier 1: LCSC; Category: Inductors; Supplier Part Number 1: C411946; Tolerance: ±10%; Rated Current: 25mA; DC Resistance: 700mΩ; RoHS: Yes; ComponentLink1Description: Datasheet; ComponentLink1URL: https://wmsc.lcsc.com/wmsc/upload/file/pdf/v2/lcsc/2304140030_Sunltech-Tech-SCL1608B1R0KSP_C411946.pdf; ComponentLink2Description: JLCPCB Part URL; ComponentLink2URL: https://jlcpcb.com/partdetail/C411946; ComponentLink3Description: LCSC Part URL; ComponentLink3URL: https://lcsc.com/product-detail/Inductors-SMD_Sunltech-Tech-Sunltech-Tech-SCL1608B1R0KSP_C411946.html
footprint IND-0603 (0603 (1608M) Inductor)
pins: 1, 2

## SCL1608B2R2KSP
designator L?  Inductance: 2.2uH
Inductor, 2.2uH, ±10%, 1.25Ω, 25mA, SMD 0603; Manufacturer: Sunltech Tech; Manufacturer Part Number: SCL1608B2R2KSP; Package Size: 0603; JLCPCB Basic Part: No; JLCPCB Part Number: C411947; Supplier 1: LCSC; Category: Inductors; Supplier Part Number 1: C411947; Tolerance: ±10%; Rated Current: 25mA; DC Resistance: 1.25Ω; RoHS: Yes; ComponentLink1Description: Datasheet; ComponentLink1URL: https://wmsc.lcsc.com/wmsc/upload/file/pdf/v2/lcsc/2304140030_Sunltech-Tech-SCL1608B2R2KSP_C411947.pdf; ComponentLink2Description: JLCPCB Part URL; ComponentLink2URL: https://jlcpcb.com/partdetail/C411947; ComponentLink3Description: LCSC Part URL; ComponentLink3URL: https://lcsc.com/product-detail/Inductors-SMD_Sunltech-Tech-Sunltech-Tech-SCL1608B2R2KSP_C411947.html
footprint IND-0603 (0603 (1608M) Inductor)
pins: 1, 2